# Altium footprint library PCB封装库.PcbLib: 109 footprints (part 5 of 7)
Each footprint in its own frame and in the unit in brackets; x right, y up, seen from the top. Pads: shape width x height; smd on the part's side, far side on the other; paste and mask are expansions set on the pad; w line width, h text height; cw(c..) or ccw(c..) is an arc to the next point about the centre after c.
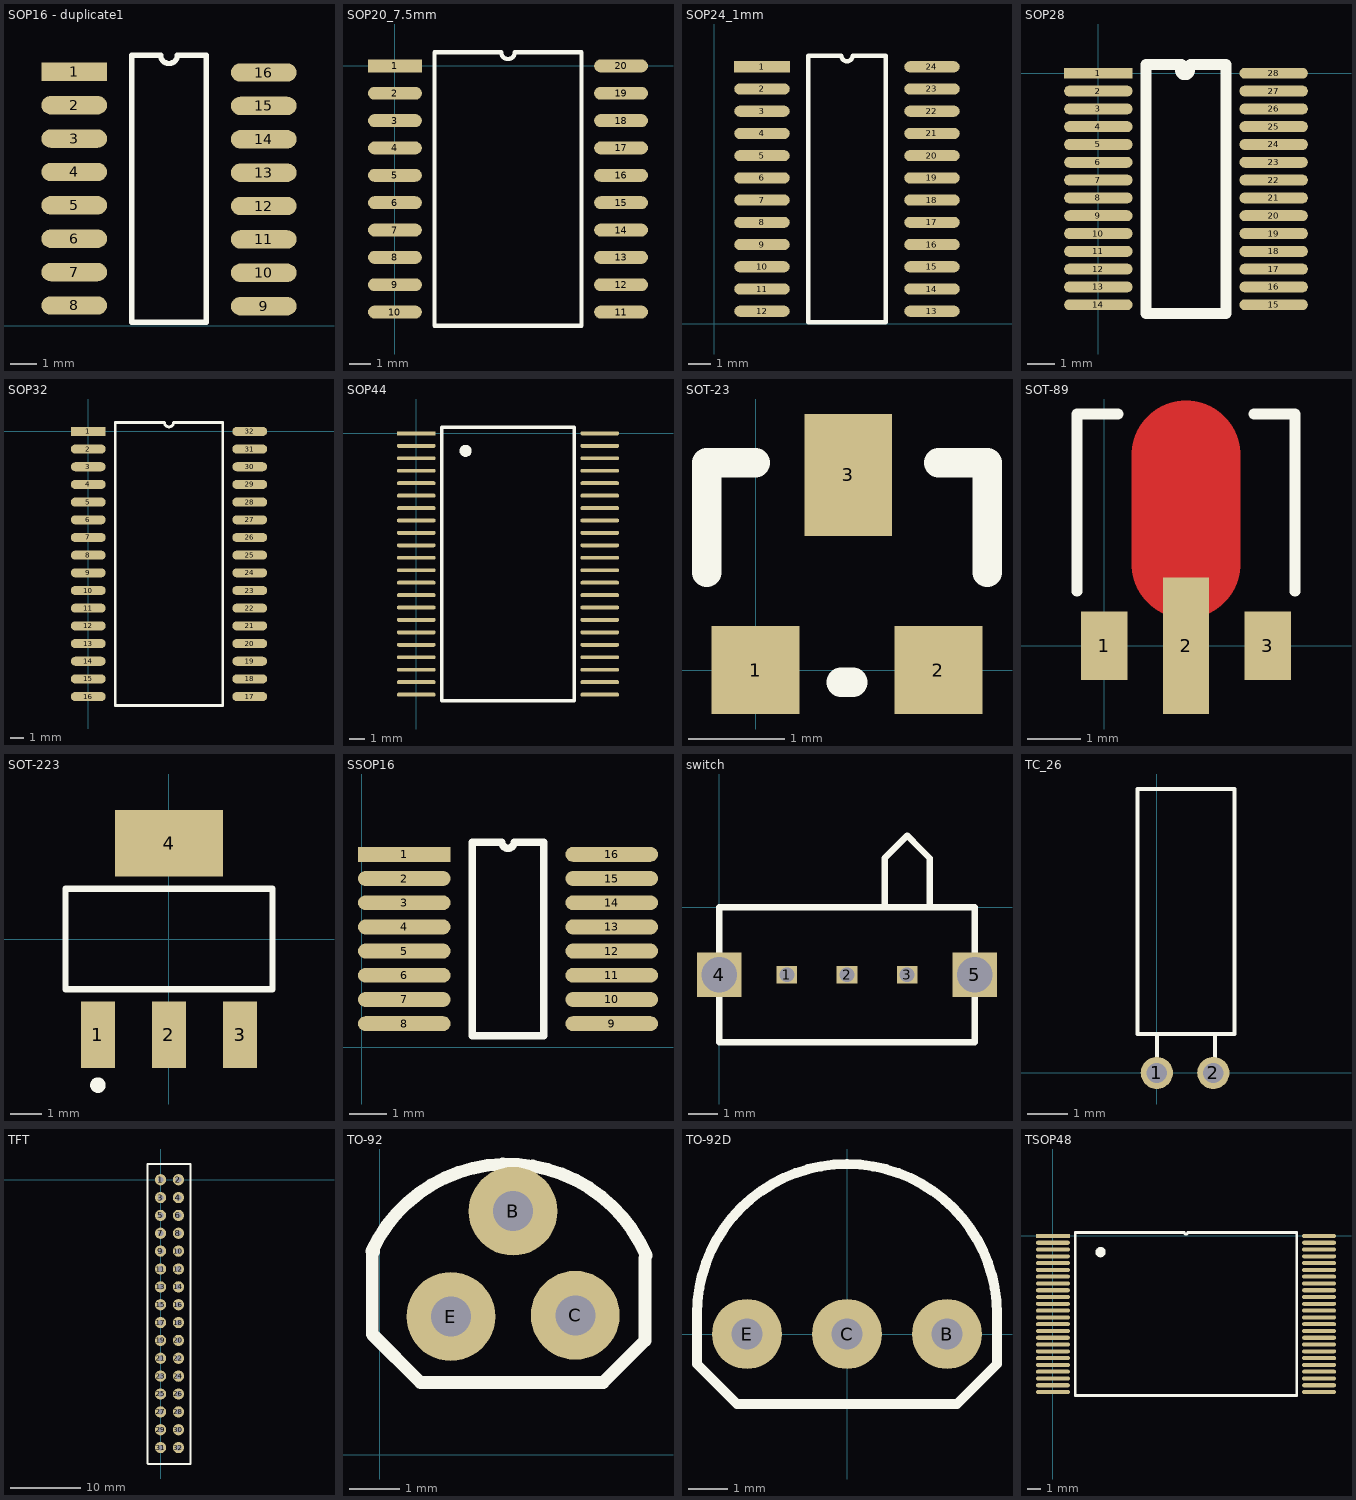
[diagram p4: the footprints below, top view; thin cyan lines are the x and y axes]

## SOP16 - duplicate1 [mm]
pads (16):
  rect 2.5x0.7 smd: 1(2.692,9.652)
  oval 2.5x0.7 smd: 2(2.692,8.382) 3(2.692,7.112) 4(2.692,5.842) 5(2.692,4.572) 6(2.692,3.302) 7(2.692,2.032) 8(2.692,0.762) 9(9.904,0.737) 10(9.904,2.007) 11(9.904,3.277) 12(9.904,4.547) 13(9.904,5.817) 14(9.904,7.087) 15(9.904,8.357) 16(9.904,9.627)
Top Overlay:
  lines w0.2: 4.883,0.127 4.883,10.287 5.98,10.287 ccw(c6.298,10.287) 6.615,10.287 7.713,10.287 7.713,0.127 4.883,0.127
3D body: height 1.8, standoff -0.2, extent 2.288,0.062 10.209,10.262

## SOP20_7.5mm [mm]
pads (20):
  rect 2.5x0.6 smd: 1(0,0)
  oval 2.5x0.6 smd: 2(0,-1.27) 3(0,-2.54) 4(0,-3.81) 5(0,-5.08) 6(0,-6.35) 7(0,-7.62) 8(0,-8.89) 9(0,-10.16) 10(0,-11.43) 11(10.5,-11.43) 12(10.5,-10.16) 13(10.5,-8.89) 14(10.5,-7.62) 15(10.5,-6.35) 16(10.5,-5.08) 17(10.5,-3.81) 18(10.5,-2.54) 19(10.5,-1.27) 20(10.5,0)
Top Overlay:
  lines w0.2: 1.835,-12.065 1.835,0.635 4.932,0.635 ccw(c5.25,0.635) 5.567,0.635 8.665,0.635 8.665,-12.065 1.835,-12.065
3D body: height 2.6, standoff 0, extent 0.032,-11.99 10.432,0.61

## SOP24_1mm [mm]
pads (24):
  rect 2.5x0.5 smd: 1(2.159,11.557)
  oval 2.5x0.5 smd: 2(2.159,10.557) 3(2.159,9.557) 4(2.159,8.557) 5(2.159,7.557) 6(2.159,6.557) 7(2.159,5.557) 8(2.159,4.557) 9(2.159,3.557) 10(2.159,2.557) 11(2.159,1.557) 12(2.159,0.557) 13(9.809,0.557) 14(9.809,1.557) 15(9.809,2.557) 16(9.809,3.557) 17(9.809,4.557) 18(9.809,5.557) 19(9.809,6.557) 20(9.809,7.557) 21(9.809,8.557) 22(9.809,9.557) 23(9.809,10.557) 24(9.809,11.557)
Top Overlay:
  lines w0.2: 4.244,0.057 4.244,12.057 5.734,12.057 ccw(c5.984,12.057) 6.234,12.057 7.724,12.057 7.724,0.057 4.244,0.057
3D body: height 2.51, standoff 0, extent 1.016,-0.254 11.322,12.446

## SOP28 [mm]
pads (28):
  rect 2.5x0.4 smd: 1(0,0)
  oval 2.5x0.4 smd: 2(0,-0.65) 3(0,-1.3) 4(0,-1.95) 5(0,-2.6) 6(0,-3.25) 7(0,-3.9) 8(0,-4.55) 9(0,-5.2) 10(0,-5.85) 11(0,-6.5) 12(0,-7.15) 13(0,-7.8) 14(0,-8.45) 15(6.4,-8.45) 16(6.4,-7.8) 17(6.4,-7.15) 18(6.4,-6.5) 19(6.4,-5.85) 20(6.4,-5.2) 21(6.4,-4.55) 22(6.4,-3.9) 23(6.4,-3.25) 24(6.4,-2.6) 25(6.4,-1.95) 26(6.4,-1.3) 27(6.4,-0.65) 28(6.4,0)
Top Overlay:
  lines w0.4: 3,0.111 ccw(c3.162,0.111) 3.325,0.111 ; 3.037,0.325 1.735,0.325 1.735,-8.775 4.665,-8.775 4.665,0.325 3.362,0.325

## SOP32 [mm]
pads (32):
  rect 2.5x0.65 smd: 1(0,0)
  oval 2.5x0.65 smd: 2(0,-1.27) 3(0,-2.54) 4(0,-3.81) 5(0,-5.08) 6(0,-6.35) 7(0,-7.62) 8(0,-8.89) 9(0,-10.16) 10(0,-11.43) 11(0,-12.7) 12(0,-13.97) 13(0,-15.24) 14(0,-16.51) 15(0,-17.78) 16(0,-19.05) 17(11.6,-19.05) 18(11.6,-17.78) 19(11.6,-16.51) 20(11.6,-15.24) 21(11.6,-13.97) 22(11.6,-12.7) 23(11.6,-11.43) 24(11.6,-10.16) 25(11.6,-8.89) 26(11.6,-7.62) 27(11.6,-6.35) 28(11.6,-5.08) 29(11.6,-3.81) 30(11.6,-2.54) 31(11.6,-1.27) 32(11.6,0)
Top Overlay:
  lines w0.2: 1.935,-19.685 1.935,0.635 5.482,0.635 ccw(c5.8,0.635) 6.117,0.635 9.665,0.635 9.665,-19.685 1.935,-19.685

## SOP44 [mm]
pads (44):
  rect 2.5x0.25 smd: 1(0,0)
  oval 2.5x0.25 smd: 2(0,-0.8) 3(0,-1.6) 4(0,-2.4) 5(0,-3.2) 6(0,-4) 7(0,-4.8) 8(0,-5.6) 9(0,-6.4) 10(0,-7.2) 11(0,-8) 12(0,-8.8) 13(0,-9.6) 14(0,-10.4) 15(0,-11.2) 16(0,-12) 17(0,-12.8) 18(0,-13.6) 19(0,-14.4) 20(0,-15.2) 21(0,-16) 22(0,-16.8) 23(11.8,-16.8) 24(11.8,-16) 25(11.8,-15.2) 26(11.8,-14.4) 27(11.8,-13.6) 28(11.8,-12.8) 29(11.8,-12) 30(11.8,-11.2) 31(11.8,-10.4) 32(11.8,-9.6) 33(11.8,-8.8) 34(11.8,-8) 35(11.8,-7.2) 36(11.8,-6.4) 37(11.8,-5.6) 38(11.8,-4.8) 39(11.8,-4) 40(11.8,-3.2) 41(11.8,-2.4) 42(11.8,-1.6) 43(11.8,-0.8) 44(11.8,0)
Top Overlay:
  circle w0.254: c3.175,-1.118 r0.262
  circle w0.254: c3.15,-1.143 r0.072
  lines w0.2: 1.635,-17.2 10.165,-17.2 10.165,0.4 6.1,0.4 5.7,0.4 1.635,0.4 1.635,-17.2

## SOT-23 [mil]
pads (3):
  rect 36x36 smd: 1(0,0) 2(75,0)
  rect 36x50 smd: 3(38,80)
Top Overlay:
  lines w12: -20,40 -20,85 0,85 ; 35,-5 40,-5 ; 75,85 95,85 95,40

## SOT-89 [mil]
pads (3):
  rect 34x50 smd: 1(0,0) 3(120,0)
  rect 34x100 smd: 2(60,0)
Top Layer:
  lines w80: 60,60 60,140
Top Overlay:
  lines w8: -20,40 -20,170 10,170 ; 110,170 140,170 140,40

## SOT-223 [mm] "SOT-223/SC-73; 4 Leads; Body 6.7 x 7.3 mm, inc. leads (LxW max)"
height 1.78
pads (4):
  rect 1.1x2.15 smd: 1(-2.3,-3.1) 2(0,-3.1) 3(2.3,-3.1)
  rect 3.5x2.15 smd: 4(0,3.1)
Top Overlay:
  circle w0.25: c-2.3,-4.725 r0.125
  lines w0.2: -3.35,-1.625 -3.35,1.625 3.35,1.625 3.35,-1.625 -3.35,-1.625
3D body: height 1.65, standoff -0.03, extent -3.251,-3.58 3.249,3.38

## SSOP16 [mm]
pads (16):
  rect 2.5x0.4 smd: 1(1.143,5.207)
  oval 2.5x0.4 smd: 2(1.143,4.554) 3(1.143,3.901) 4(1.143,3.248) 5(1.143,2.595) 6(1.143,1.942) 7(1.143,1.289) 8(1.143,0.636) 9(6.743,0.636) 10(6.743,1.289) 11(6.743,1.942) 12(6.743,2.595) 13(6.743,3.248) 14(6.743,3.901) 15(6.743,4.554) 16(6.743,5.207)
Top Overlay:
  lines w0.2: 2.978,0.309 2.978,5.533 3.78,5.533 ccw(c3.943,5.533) 4.106,5.533 4.908,5.533 4.908,0.309 2.978,0.309
3D body: height 1.75, standoff 0.01, extent 0.762,0.421 7.015,5.421

## switch [mm]
pads (5):
  rect 0.7x0.6 hole 0.5 paste+0: 1(2.286,-2.286) 2(4.318,-2.286) 3(6.35,-2.286)
  rect 1.5x1.5 hole 1.2 paste+0: 4(0,-2.286) 5(8.636,-2.286)
Top Overlay:
  lines w0.221: 5.588,0.127 5.588,1.651 6.35,2.413 6.794,1.968 7.112,1.651 7.112,0.127 ; 0,-4.572 0,0 8.636,0 8.636,-4.572 0,-4.572
3D body: height 5, standoff -2.49, extent -0.013,-4.461 8.598,3.912

## TC_26 [mm]
pads (2):
  round 0.8 hole 0.5: 1(0,0) 2(1.4,0)
Top Overlay:
  lines w0.1: 0.025,0 0,0 0,0.965 ; 1.4,0 1.448,0 1.448,0.965 0,0.965 ; 0,0.965 -0.483,0.965 -0.483,7.036 1.93,7.036 1.93,0.965 0,0.965

## TFT [mm]
pads (32):
  round 1.6 hole 0.8: 1(0,0) 2(2.54,0) 3(0,-2.54) 4(2.54,-2.54) 5(0,-5.08) 6(2.54,-5.08) 7(0,-7.62) 8(2.54,-7.62) 9(0,-10.16) 10(2.54,-10.16) 11(0,-12.7) 12(2.54,-12.7) 13(0,-15.24) 14(2.54,-15.24) 15(0,-17.78) 16(2.54,-17.78) 17(0,-20.32) 18(2.54,-20.32) 19(0,-22.86) 20(2.54,-22.86) 21(0,-25.4) 22(2.54,-25.4) 23(0,-27.94) 24(2.54,-27.94) 25(0,-30.48) 26(2.54,-30.48) 27(0,-33.02) 28(2.54,-33.02) 29(0,-35.56) 30(2.54,-35.56) 31(0,-38.1) 32(2.54,-38.1)
Top Overlay:
  lines w0.245: -1.854,-40.411 -1.829,-40.437 4.242,-40.437 4.242,2.235 -1.346,2.235 -1.854,2.235 -1.854,-40.411

## TO-92 [mil]
pads (3):
  round 70 hole 31.5: B(105,192) C(154,110) E(56,109)
Top Overlay:
  lines w10: -6.34,160.46 cw(c101,111) 209.84,157.08 ; -5,160 -6,159 -6,95 32,57 176,57 209,90 209,155
3D body: height 327.95, standoff -157.48, extent 0,54.11 209.45,217.89

## TO-92D [mil]
pads (3):
  round 70 hole 31.5: B(100,0) C(0,0) E(-100,0)
Top Overlay:
  lines w10: -150,-30 -110,-70 110,-70 150,-30 150,20 ccw(c0,20) -150,20 -150,-30

## TSOP48 [mm]
pads (48):
  rect 2.5x0.3 smd: 1(0,0)
  oval 2.5x0.3 smd: 2(0,-0.5) 3(0,-1) 4(0,-1.5) 5(0,-2) 6(0,-2.5) 7(0,-3) 8(0,-3.5) 9(0,-4) 10(0,-4.5) 11(0,-5) 12(0,-5.5) 13(0,-6) 14(0,-6.5) 15(0,-7) 16(0,-7.5) 17(0,-8) 18(0,-8.5) 19(0,-9) 20(0,-9.5) 21(0,-10) 22(0,-10.5) 23(0,-11) 24(0,-11.5) 25(19.6,-11.5) 26(19.6,-11) 27(19.6,-10.5) 28(19.6,-10) 29(19.6,-9.5) 30(19.6,-9) 31(19.6,-8.5) 32(19.6,-8) 33(19.6,-7.5) 34(19.6,-7) 35(19.6,-6.5) 36(19.6,-6) 37(19.6,-5.5) 38(19.6,-5) 39(19.6,-4.5) 40(19.6,-4) 41(19.6,-3.5) 42(19.6,-3) 43(19.6,-2.5) 44(19.6,-2) 45(19.6,-1.5) 46(19.6,-1) 47(19.6,-0.5) 48(19.6,0)
Top Overlay:
  circle w0.254: c3.531,-1.194 r0.051
  circle w0.254: c3.505,-1.194 r0.254
  lines w0.2: 1.635,-11.75 1.635,0.25 9.675,0.25 ccw(c9.8,0.25) 9.925,0.25 17.965,0.25 17.965,-11.75 1.635,-11.75